# Altium footprint library Reflow3D1411sep.PcbLib: 657 footprints (part 24 of 42)
Each footprint in its own frame and in the unit in brackets; x right, y up, seen from the top. Pads: shape width x height; smd on the part's side, far side on the other; paste and mask are expansions set on the pad; w line width, h text height; cw(c..) or ccw(c..) is an arc to the next point about the centre after c.
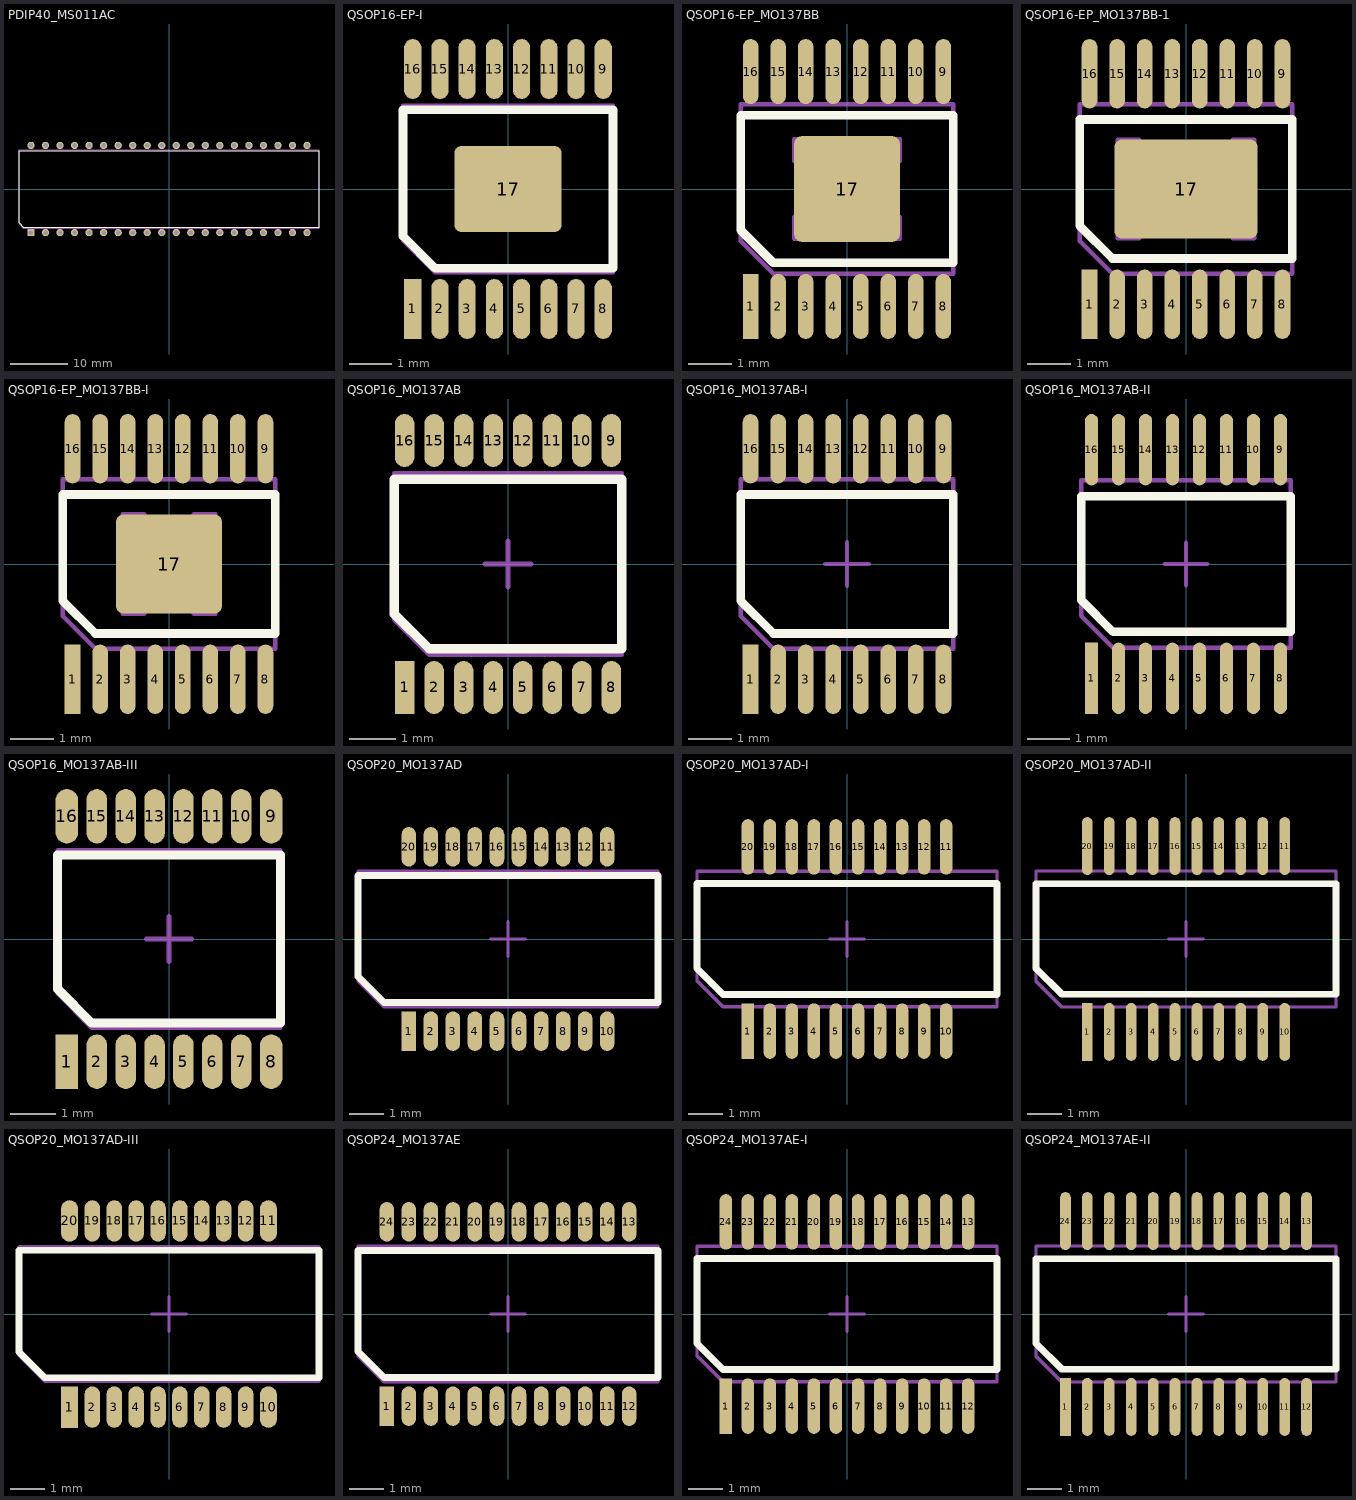
[diagram p23: the footprints below, top view; thin cyan lines are the x and y axes]

## PDIP40_MS011AC [mil] "www.ti.com, mpdi008.pdf, N40.asc"
height 172.44
pads (40):
  rect 50x50 hole 31: 1(-950,-300)
  round 50 hole 31: 2(-850,-300) 3(-750,-300) 4(-650,-300) 5(-550,-300) 6(-450,-300) 7(-350,-300) 8(-250,-300) 9(-150,-300) 10(-50,-300) 11(50,-300) 12(150,-300) 13(250,-300) 14(350,-300) 15(450,-300) 16(550,-300) 17(650,-300) 18(750,-300) 19(850,-300) 20(950,-300) 21(950,300) 22(850,300) 23(750,300) 24(650,300) 25(550,300) 26(450,300) 27(350,300) 28(250,300) 29(150,300) 30(50,300) 31(-50,300) 32(-150,300) 33(-250,300) 34(-350,300) 35(-450,300) 36(-550,300) 37(-650,300) 38(-750,300) 39(-850,300) 40(-950,300)
Top Overlay:
  lines w7.87: -1032.48,-233.27 -1032.48,262.8 1032.48,262.8 1032.48,-262.8 -1002.95,-262.8 -1032.48,-233.27
Mechanical 13:
  lines w3.94: -1032.48,-240.55 -1032.48,270.08 1032.48,270.08 1032.48,-270.08 -1002.95,-270.08 -1032.48,-240.55
3D body: height 200, standoff 0, extent -1044.88,-279.92 1044.88,279.92

## QSOP16-EP-I [mm] "www.hittite.com, qs16_qs16g_package_info.pdf"
height 1.55
pads (17):
  rect 0.4x1.4 smd mask+0.05: 1(-2.222,-2.8)
  oval 0.4x1.4 smd mask+0.05: 2(-1.587,-2.8) 3(-0.953,-2.8) 4(-0.318,-2.8) 5(0.318,-2.8) 6(0.953,-2.8) 7(1.587,-2.8) 8(2.222,-2.8) 9(2.222,2.8) 10(1.587,2.8) 11(0.953,2.8) 12(0.318,2.8) 13(-0.318,2.8) 14(-0.953,2.8) 15(-1.587,2.8) 16(-2.222,2.8)
  rrect15% 2.5x2 smd mask+0.075: 17(0,0)
Top Overlay:
  lines w0.2: -2.45,-1.1 -2.45,1.85 2.45,1.85 2.45,-1.85 -1.7,-1.85 -2.45,-1.1
Mechanical 13:
  lines w0.1: -1.15,-0.375 -1.15,-0.875 -0.65,-0.875 ; -1.15,0.375 -1.15,0.875 -0.65,0.875 ; 0.65,-0.875 1.15,-0.875 1.15,-0.375 ; 0.65,0.875 1.15,0.875 1.15,0.375 ; -2.45,-1.2 -1.7,-1.95 2.45,-1.95 2.45,1.95 -2.45,1.95 -2.45,-1.2
Mechanical 15:
  lines w0.1: -0.5,0 0.5,0 ; 0,-0.5 0,0.5
3D body: height 1.75, standoff 0, extent -2.5,-2 2.5,2

## QSOP16-EP_MO137BB [mm] "www.analog.com, RC_16.pdf, rc-16.pdf; www.jedec.org, mo-187e.pdf"
height 1.55
pads (17):
  rect 0.36x1.5 smd mask+0.075: 1(-2.222,-2.708)
  oval 0.36x1.5 smd mask+0.075: 2(-1.587,-2.708) 3(-0.953,-2.708) 4(-0.318,-2.708) 5(0.318,-2.708) 6(0.953,-2.708) 7(1.587,-2.708) 8(2.222,-2.708) 9(2.222,2.708) 10(1.587,2.708) 11(0.953,2.708) 12(0.318,2.708) 13(-0.318,2.708) 14(-0.953,2.708) 15(-1.587,2.708) 16(-2.222,2.708)
  rrect15% 2.44x2.44 smd mask+0.075: 17(0,0)
Top Overlay:
  lines w0.2: -2.45,-0.95 -1.7,-1.7 2.45,-1.7 2.45,1.7 -2.45,1.7 -2.45,-0.95
Mechanical 13:
  lines w0.1: -1.22,-0.645 -1.22,-1.145 -0.72,-1.145 ; -1.22,0.645 -1.22,1.145 -0.72,1.145 ; 0.72,-1.145 1.22,-1.145 1.22,-0.645 ; 0.72,1.145 1.22,1.145 1.22,0.645 ; -2.45,-1.2 -2.45,1.95 2.45,1.95 2.45,-1.95 -1.7,-1.95 -2.45,-1.2
Mechanical 15:
  lines w0.1: -0.5,0 0.5,0 ; 0,-0.5 0,0.5
3D body: height 1.75, standoff 0, extent -2.5,-2 2.5,2

## QSOP16-EP_MO137BB-1 [mm] "www.maxim-ic.com, 21-0112.PDF, 90-0239.PDF"
height 1.53
pads (17):
  rect 0.36x1.6 smd mask+0.075: 1(-2.222,-2.655)
  oval 0.36x1.6 smd mask+0.075: 2(-1.587,-2.655) 3(-0.953,-2.655) 4(-0.318,-2.655) 5(0.318,-2.655) 6(0.953,-2.655) 7(1.587,-2.655) 8(2.222,-2.655) 9(2.222,2.655) 10(1.587,2.655) 11(0.953,2.655) 12(0.318,2.655) 13(-0.318,2.655) 14(-0.953,2.655) 15(-1.587,2.655) 16(-2.222,2.655)
  rrect15% 3.3x2.29 smd mask+0.075: 17(0,0)
Top Overlay:
  lines w0.2: -2.445,-0.85 -1.695,-1.6 2.445,-1.6 2.445,1.6 -2.445,1.6 -2.445,-0.85
Mechanical 13:
  lines w0.1: -1.575,-0.635 -1.575,-1.135 -1.075,-1.135 ; -1.575,0.635 -1.575,1.135 -1.075,1.135 ; 1.075,-1.135 1.575,-1.135 1.575,-0.635 ; 1.075,1.135 1.575,1.135 1.575,0.635 ; -2.445,-1.2 -1.695,-1.95 2.445,-1.95 2.445,1.95 -2.445,1.95 -2.445,-1.2
Mechanical 15:
  lines w0.1: -0.5,0 0.5,0 ; 0,-0.5 0,0.5
3D body: height 1.65, standoff 0, extent -2.49,-1.995 2.49,1.995

## QSOP16-EP_MO137BB-I [mm] "www.maxim-ic.com, 21-0112.PDF, 90-0240.PDF"
height 1.53
pads (17):
  rect 0.36x1.6 smd mask+0.075: 1(-2.222,-2.655)
  oval 0.36x1.6 smd mask+0.075: 2(-1.587,-2.655) 3(-0.953,-2.655) 4(-0.318,-2.655) 5(0.318,-2.655) 6(0.953,-2.655) 7(1.587,-2.655) 8(2.222,-2.655) 9(2.222,2.655) 10(1.587,2.655) 11(0.953,2.655) 12(0.318,2.655) 13(-0.318,2.655) 14(-0.953,2.655) 15(-1.587,2.655) 16(-2.222,2.655)
  rrect15% 2.44x2.29 smd mask+0.075: 17(0,0)
Top Overlay:
  lines w0.2: -2.445,-0.85 -2.445,1.6 2.445,1.6 2.445,-1.6 -1.695,-1.6 -2.445,-0.85
Mechanical 13:
  lines w0.1: -1.07,-0.645 -1.07,-1.145 -0.57,-1.145 ; -1.07,0.645 -1.07,1.145 -0.57,1.145 ; 0.57,-1.145 1.07,-1.145 1.07,-0.645 ; 0.57,1.145 1.07,1.145 1.07,0.645 ; -2.445,-1.2 -2.445,1.95 2.445,1.95 2.445,-1.95 -1.695,-1.95 -2.445,-1.2
Mechanical 15:
  lines w0.1: -0.5,0 0.5,0 ; 0,-0.5 0,0.5
3D body: height 1.65, standoff 0, extent -2.49,-1.995 2.49,1.995

## QSOP16_MO137AB [mm] "www.linear.com, SSOP_16_05-08-1641.pdf; www.jedec.org, mo-187e.pdf"
height 1.55
pads (16):
  rect 0.42x1.14 smd mask+0.05: 1(-2.222,-2.655)
  oval 0.42x1.14 smd mask+0.05: 2(-1.587,-2.655) 3(-0.953,-2.655) 4(-0.318,-2.655) 5(0.318,-2.655) 6(0.953,-2.655) 7(1.587,-2.655) 8(2.222,-2.655) 9(2.222,2.655) 10(1.587,2.655) 11(0.953,2.655) 12(0.318,2.655) 13(-0.318,2.655) 14(-0.953,2.655) 15(-1.587,2.655) 16(-2.222,2.655)
Top Overlay:
  lines w0.2: -2.445,-1.075 -2.445,1.825 2.445,1.825 2.445,-1.825 -1.695,-1.825 -2.445,-1.075
Mechanical 13:
  lines w0.1: -2.445,-1.2 -2.445,1.95 2.445,1.95 2.445,-1.95 -1.695,-1.95 -2.445,-1.2
Mechanical 15:
  lines w0.1: -0.5,0 0.5,0 ; 0,-0.5 0,0.5
3D body: height 1.75, standoff 0, extent -2.49,-1.995 2.49,1.995

## QSOP16_MO137AB-I [mm] "www.maxim-ic.com, 21-0055.PDF, 90-0167.PDF"
height 1.55
pads (16):
  rect 0.36x1.6 smd mask+0.075: 1(-2.222,-2.655)
  oval 0.36x1.6 smd mask+0.075: 2(-1.587,-2.655) 3(-0.953,-2.655) 4(-0.318,-2.655) 5(0.318,-2.655) 6(0.953,-2.655) 7(1.587,-2.655) 8(2.222,-2.655) 9(2.222,2.655) 10(1.587,2.655) 11(0.953,2.655) 12(0.318,2.655) 13(-0.318,2.655) 14(-0.953,2.655) 15(-1.587,2.655) 16(-2.222,2.655)
Top Overlay:
  lines w0.2: -2.445,-0.85 -1.695,-1.6 2.445,-1.6 2.445,1.6 -2.445,1.6 -2.445,-0.85
Mechanical 13:
  lines w0.1: -2.445,-1.2 -1.695,-1.95 2.445,-1.95 2.445,1.95 -2.445,1.95 -2.445,-1.2
Mechanical 15:
  lines w0.1: -0.5,0 0.5,0 ; 0,-0.5 0,0.5
3D body: height 1.75, standoff 0, extent -2.49,-1.995 2.49,1.995

## QSOP16_MO137AB-II [mm] "www.idt.com, PSC4040.pdf"
height 1.63
pads (16):
  rect 0.31x1.68 smd mask+0.075: 1(-2.222,-2.69)
  oval 0.31x1.68 smd mask+0.075: 2(-1.587,-2.69) 3(-0.953,-2.69) 4(-0.318,-2.69) 5(0.318,-2.69) 6(0.953,-2.69) 7(1.587,-2.69) 8(2.222,-2.69) 9(2.222,2.69) 10(1.587,2.69) 11(0.953,2.69) 12(0.318,2.69) 13(-0.318,2.69) 14(-0.953,2.69) 15(-1.587,2.69) 16(-2.222,2.69)
Top Overlay:
  lines w0.2: -2.465,-0.85 -1.715,-1.6 2.465,-1.6 2.465,1.6 -2.465,1.6 -2.465,-0.85
Mechanical 13:
  lines w0.1: -2.465,-1.22 -2.465,1.97 2.465,1.97 2.465,-1.97 -1.715,-1.97 -2.465,-1.22
Mechanical 15:
  lines w0.1: -0.5,0 0.5,0 ; 0,-0.5 0,0.5
3D body: height 1.73, standoff 0, extent -2.49,-1.995 2.49,1.995

## QSOP16_MO137AB-III [mm] "www.nxp.com, sot519-1_po.pdf, SOT519-1_fp_reflow.pdf"
height 1.62
pads (16):
  rect 0.5x1.2 smd mask+0.075: 1(-2.248,-2.7)
  oval 0.45x1.2 smd mask+0.075: 2(-1.587,-2.7) 3(-0.953,-2.7) 4(-0.318,-2.7) 5(0.318,-2.7) 6(0.953,-2.7) 7(1.587,-2.7) 10(1.587,2.7) 11(0.953,2.7) 12(0.318,2.7) 13(-0.318,2.7) 14(-0.953,2.7) 15(-1.587,2.7)
  oval 0.5x1.2 smd mask+0.075: 8(2.248,-2.7) 9(2.248,2.7) 16(-2.248,2.7)
Top Overlay:
  lines w0.2: -2.45,-1.1 -1.7,-1.85 2.45,-1.85 2.45,1.85 -2.45,1.85 -2.45,-1.1
Top Solder:
  region: 1.94,-3.15 1.94,-2.25 1.875,-2.25 1.875,-3.15
  region: 1.94,2.25 1.94,3.15 1.875,3.15 1.875,2.25
  region: -1.94,3.15 -1.94,2.25 -1.875,2.25 -1.875,3.15
  region: 1.24,3.15 1.24,2.25 1.3,2.25 1.3,3.15
  region: 0.605,3.15 0.605,2.25 0.665,2.25 0.665,3.15
  region: -0.03,3.15 -0.03,2.25 0.03,2.25 0.03,3.15
  region: -0.665,3.15 -0.665,2.25 -0.605,2.25 -0.605,3.15
  region: -1.3,3.15 -1.3,2.25 -1.24,2.25 -1.24,3.15
  region: 1.24,-2.25 1.24,-3.15 1.3,-3.15 1.3,-2.25
  region: 0.605,-2.25 0.605,-3.15 0.665,-3.15 0.665,-2.25
  region: -0.03,-2.25 -0.03,-3.15 0.03,-3.15 0.03,-2.25
  region: -0.665,-2.25 -0.665,-3.15 -0.605,-3.15 -0.605,-2.25
  region: -1.3,-2.25 -1.3,-3.15 -1.24,-3.15 -1.24,-2.25
  region: -1.925,-2.25 -1.925,-3.15 -1.875,-3.15 -1.875,-2.25
Mechanical 13:
  lines w0.1: -2.45,-1.2 -1.7,-1.95 2.45,-1.95 2.45,1.95 -2.45,1.95 -2.45,-1.2
Mechanical 15:
  lines w0.1: -0.5,0 0.5,0 ; 0,-0.5 0,0.5
3D body: height 1.73, standoff 0, extent -2.5,-2 2.5,2

## QSOP20_MO137AD [mm] "www.linear.com, SSOP_20_05-08-1641.pdf; www.jedec.org, mo-187e.pdf"
height 1.55
pads (20):
  rect 0.42x1.14 smd mask+0.05: 1(-2.857,-2.655)
  oval 0.42x1.14 smd mask+0.05: 2(-2.222,-2.655) 3(-1.587,-2.655) 4(-0.953,-2.655) 5(-0.318,-2.655) 6(0.318,-2.655) 7(0.953,-2.655) 8(1.587,-2.655) 9(2.222,-2.655) 10(2.857,-2.655) 11(2.857,2.655) 12(2.222,2.655) 13(1.587,2.655) 14(0.953,2.655) 15(0.318,2.655) 16(-0.318,2.655) 17(-0.953,2.655) 18(-1.587,2.655) 19(-2.222,2.655) 20(-2.857,2.655)
Top Overlay:
  lines w0.2: -4.325,-1.075 -3.575,-1.825 4.325,-1.825 4.325,1.825 -4.325,1.825 -4.325,-1.075
Mechanical 13:
  lines w0.1: -4.325,-1.2 -3.575,-1.95 4.325,-1.95 4.325,1.95 -4.325,1.95 -4.325,-1.2
Mechanical 15:
  lines w0.1: -0.5,0 0.5,0 ; 0,-0.5 0,0.5
3D body: height 1.75, standoff 0, extent -4.37,-1.995 4.37,1.995

## QSOP20_MO137AD-I [mm] "www.maxim-ic.com, 21-0055.PDF, 90-0168.PDF"
height 1.55
pads (20):
  rect 0.36x1.6 smd mask+0.075: 1(-2.857,-2.655)
  oval 0.36x1.6 smd mask+0.075: 2(-2.222,-2.655) 3(-1.587,-2.655) 4(-0.953,-2.655) 5(-0.318,-2.655) 6(0.318,-2.655) 7(0.953,-2.655) 8(1.587,-2.655) 9(2.222,-2.655) 10(2.857,-2.655) 11(2.857,2.655) 12(2.222,2.655) 13(1.587,2.655) 14(0.953,2.655) 15(0.318,2.655) 16(-0.318,2.655) 17(-0.953,2.655) 18(-1.587,2.655) 19(-2.222,2.655) 20(-2.857,2.655)
Top Overlay:
  lines w0.2: -4.325,-0.85 -4.325,1.6 4.325,1.6 4.325,-1.6 -3.575,-1.6 -4.325,-0.85
Mechanical 13:
  lines w0.1: -4.325,-1.2 -4.325,1.95 4.325,1.95 4.325,-1.95 -3.575,-1.95 -4.325,-1.2
Mechanical 15:
  lines w0.1: -0.5,0 0.5,0 ; 0,-0.5 0,0.5
3D body: height 1.75, standoff 0, extent -4.37,-1.995 4.37,1.995

## QSOP20_MO137AD-II [mm] "www.idt.com, PSC4040.pdf"
height 1.63
pads (20):
  rect 0.31x1.68 smd mask+0.075: 1(-2.857,-2.69)
  oval 0.31x1.68 smd mask+0.075: 2(-2.222,-2.69) 3(-1.587,-2.69) 4(-0.953,-2.69) 5(-0.318,-2.69) 6(0.318,-2.69) 7(0.953,-2.69) 8(1.587,-2.69) 9(2.222,-2.69) 10(2.857,-2.69) 11(2.857,2.69) 12(2.222,2.69) 13(1.587,2.69) 14(0.953,2.69) 15(0.318,2.69) 16(-0.318,2.69) 17(-0.953,2.69) 18(-1.587,2.69) 19(-2.222,2.69) 20(-2.857,2.69)
Top Overlay:
  lines w0.2: -4.345,-0.85 -4.345,1.6 4.345,1.6 4.345,-1.6 -3.595,-1.6 -4.345,-0.85
Mechanical 13:
  lines w0.1: -4.345,-1.22 -4.345,1.97 4.345,1.97 4.345,-1.97 -3.595,-1.97 -4.345,-1.22
Mechanical 15:
  lines w0.1: -0.5,0 0.5,0 ; 0,-0.5 0,0.5
3D body: height 1.73, standoff 0, extent -4.37,-1.995 4.37,1.995

## QSOP20_MO137AD-III [mm] "www.nxp.com, sot724-1_po.pdf, SOT724-1_fp_reflow.pdf"
height 1.62
pads (20):
  rect 0.5x1.2 smd mask+0.075: 1(-2.883,-2.7)
  oval 0.45x1.2 smd mask+0.075: 2(-2.222,-2.7) 3(-1.587,-2.7) 4(-0.953,-2.7) 5(-0.318,-2.7) 6(0.318,-2.7) 7(0.953,-2.7) 8(1.587,-2.7) 9(2.222,-2.7) 12(2.222,2.7) 13(1.587,2.7) 14(0.953,2.7) 15(0.318,2.7) 16(-0.318,2.7) 17(-0.953,2.7) 18(-1.587,2.7) 19(-2.222,2.7)
  oval 0.5x1.2 smd mask+0.075: 10(2.883,-2.7) 11(2.883,2.7) 20(-2.883,2.7)
Top Overlay:
  lines w0.2: -4.35,-1.1 -4.35,1.85 4.35,1.85 4.35,-1.85 -3.6,-1.85 -4.35,-1.1
Top Solder:
  region: -2.56,-2.25 -2.56,-3.15 -2.51,-3.15 -2.51,-2.25
  region: -1.935,-2.25 -1.935,-3.15 -1.875,-3.15 -1.875,-2.25
  region: -1.3,-2.25 -1.3,-3.15 -1.24,-3.15 -1.24,-2.25
  region: 0.605,-2.25 0.605,-3.15 0.665,-3.15 0.665,-2.25
  region: 1.24,-2.25 1.24,-3.15 1.3,-3.15 1.3,-2.25
  region: 1.875,-2.25 1.875,-3.15 1.935,-3.15 1.935,-2.25
  region: -1.935,3.15 -1.935,2.25 -1.875,2.25 -1.875,3.15
  region: -1.3,3.15 -1.3,2.25 -1.24,2.25 -1.24,3.15
  region: 0.605,3.15 0.605,2.25 0.665,2.25 0.665,3.15
  region: 1.24,3.15 1.24,2.25 1.3,2.25 1.3,3.15
  region: 1.875,3.15 1.875,2.25 1.935,2.25 1.935,3.15
  region: -2.575,3.15 -2.575,2.25 -2.51,2.25 -2.51,3.15
  region: 2.575,2.25 2.575,3.15 2.51,3.15 2.51,2.25
  region: 2.575,-3.15 2.575,-2.25 2.51,-2.25 2.51,-3.15
  region: -0.03,3.15 -0.03,2.25 0.03,2.25 0.03,3.15
  region: -0.665,3.15 -0.665,2.25 -0.605,2.25 -0.605,3.15
  region: -0.03,-2.25 -0.03,-3.15 0.03,-3.15 0.03,-2.25
  region: -0.665,-2.25 -0.665,-3.15 -0.605,-3.15 -0.605,-2.25
Mechanical 13:
  lines w0.1: -4.35,-1.2 -3.6,-1.95 4.35,-1.95 4.35,1.95 -4.35,1.95 -4.35,-1.2
Mechanical 15:
  lines w0.1: -0.5,0 0.5,0 ; 0,-0.5 0,0.5
3D body: height 1.73, standoff 0, extent -4.4,-2 4.4,2

## QSOP24_MO137AE [mm] "www.linear.com, SSOP_24_05-08-1641.pdf; www.jedec.org, mo-187e.pdf"
height 1.55
pads (24):
  rect 0.42x1.14 smd mask+0.05: 1(-3.492,-2.655)
  oval 0.42x1.14 smd mask+0.05: 2(-2.857,-2.655) 3(-2.222,-2.655) 4(-1.587,-2.655) 5(-0.953,-2.655) 6(-0.318,-2.655) 7(0.318,-2.655) 8(0.953,-2.655) 9(1.587,-2.655) 10(2.222,-2.655) 11(2.857,-2.655) 12(3.492,-2.655) 13(3.492,2.655) 14(2.857,2.655) 15(2.222,2.655) 16(1.587,2.655) 17(0.953,2.655) 18(0.318,2.655) 19(-0.318,2.655) 20(-0.953,2.655) 21(-1.587,2.655) 22(-2.222,2.655) 23(-2.857,2.655) 24(-3.492,2.655)
Top Overlay:
  lines w0.2: -4.325,-1.075 -4.325,1.825 4.325,1.825 4.325,-1.825 -3.575,-1.825 -4.325,-1.075
Mechanical 13:
  lines w0.1: -4.325,-1.2 -4.325,1.95 4.325,1.95 4.325,-1.95 -3.575,-1.95 -4.325,-1.2
Mechanical 15:
  lines w0.1: -0.5,0 0.5,0 ; 0,-0.5 0,0.5
3D body: height 1.75, standoff 0, extent -4.37,-1.995 4.37,1.995

## QSOP24_MO137AE-I [mm] "www.maxim-ic.com, 21-0055.PDF, 90-0172.PDF"
height 1.55
pads (24):
  rect 0.36x1.6 smd mask+0.075: 1(-3.492,-2.655)
  oval 0.36x1.6 smd mask+0.075: 2(-2.857,-2.655) 3(-2.222,-2.655) 4(-1.587,-2.655) 5(-0.953,-2.655) 6(-0.318,-2.655) 7(0.318,-2.655) 8(0.953,-2.655) 9(1.587,-2.655) 10(2.222,-2.655) 11(2.857,-2.655) 12(3.492,-2.655) 13(3.492,2.655) 14(2.857,2.655) 15(2.222,2.655) 16(1.587,2.655) 17(0.953,2.655) 18(0.318,2.655) 19(-0.318,2.655) 20(-0.953,2.655) 21(-1.587,2.655) 22(-2.222,2.655) 23(-2.857,2.655) 24(-3.492,2.655)
Top Overlay:
  lines w0.2: -4.325,-0.85 -3.575,-1.6 4.325,-1.6 4.325,1.6 -4.325,1.6 -4.325,-0.85
Mechanical 13:
  lines w0.1: -4.325,-1.2 -4.325,1.95 4.325,1.95 4.325,-1.95 -3.575,-1.95 -4.325,-1.2
Mechanical 15:
  lines w0.1: -0.5,0 0.5,0 ; 0,-0.5 0,0.5
3D body: height 1.75, standoff 0, extent -4.37,-1.995 4.37,1.995

## QSOP24_MO137AE-II [mm] "www.idt.com, PSC4040.pdf"
height 1.63
pads (24):
  rect 0.31x1.68 smd mask+0.075: 1(-3.492,-2.69)
  oval 0.31x1.68 smd mask+0.075: 2(-2.857,-2.69) 3(-2.222,-2.69) 4(-1.587,-2.69) 5(-0.953,-2.69) 6(-0.318,-2.69) 7(0.318,-2.69) 8(0.953,-2.69) 9(1.587,-2.69) 10(2.222,-2.69) 11(2.857,-2.69) 12(3.492,-2.69) 13(3.492,2.69) 14(2.857,2.69) 15(2.222,2.69) 16(1.587,2.69) 17(0.953,2.69) 18(0.318,2.69) 19(-0.318,2.69) 20(-0.953,2.69) 21(-1.587,2.69) 22(-2.222,2.69) 23(-2.857,2.69) 24(-3.492,2.69)
Top Overlay:
  lines w0.2: -4.345,-0.85 -4.345,1.6 4.345,1.6 4.345,-1.6 -3.595,-1.6 -4.345,-0.85
Mechanical 13:
  lines w0.1: -4.345,-1.22 -4.345,1.97 4.345,1.97 4.345,-1.97 -3.595,-1.97 -4.345,-1.22
Mechanical 15:
  lines w0.1: -0.5,0 0.5,0 ; 0,-0.5 0,0.5
3D body: height 1.73, standoff 0, extent -4.37,-1.995 4.37,1.995